# Altium footprint library connectors.PcbLib: 98 footprints (part 5 of 7)
Each footprint in its own frame and in the unit in brackets; x right, y up, seen from the top. Pads: shape width x height; smd on the part's side, far side on the other; paste and mask are expansions set on the pad; w line width, h text height; cw(c..) or ccw(c..) is an arc to the next point about the centre after c.
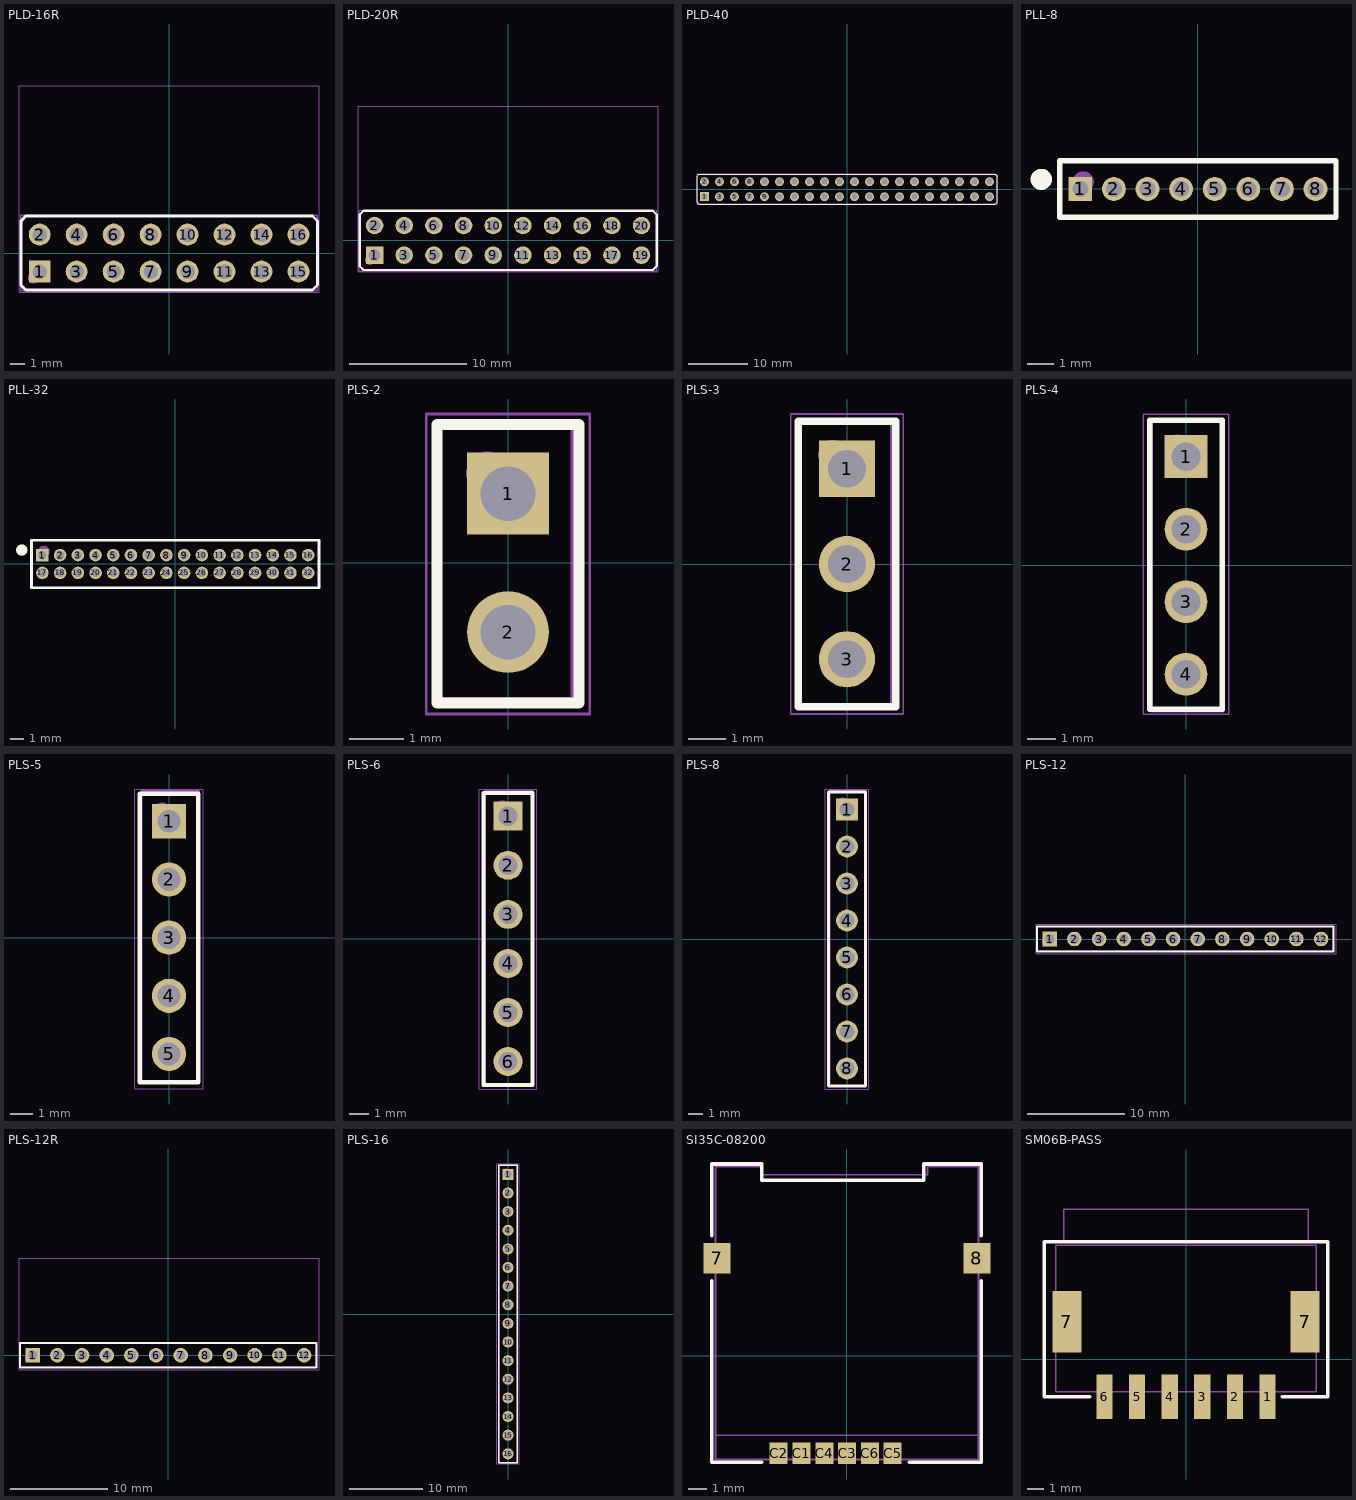
[diagram p4: the footprints below, top view; thin cyan lines are the x and y axes]

## PLD-16R [mm]
height 5
pads (16):
  rect 1.5x1.5 hole 1: 1(-8.89,-1.27)
  round 1.5 hole 1: 2(-8.89,1.27) 3(-6.35,-1.27) 4(-6.35,1.27) 5(-3.81,-1.27) 6(-3.81,1.27) 7(-1.27,-1.27) 8(-1.27,1.27) 9(1.27,-1.27) 10(1.27,1.27) 11(3.81,-1.27) 12(3.81,1.27) 13(6.35,-1.27) 14(6.35,1.27) 15(8.89,-1.27) 16(8.89,1.27)
Top Overlay:
  lines w0.2: -10.16,-2.222 -10.16,2.222 -9.842,2.54 9.85,2.54 10.19,2.2 10.19,-2.2 9.85,-2.54 -9.842,-2.54 -10.16,-2.222
Top Assy:
  circle w0.4: c-9.3,-1.7 r0.2
  lines w0.1: -10.2,-2.6 10.19,-2.6 10.19,2.6 -10.2,2.6 -10.2,-2.6
Top Cortyard:
  lines w0.05: -10.31,-2.7 10.3,-2.7 10.3,11.5 -10.31,11.5 -10.31,-2.7
3D body "DS1022-2x8RF11.stp": height 5.08, standoff -3, extent -10.2,-1.625 10.12,11.425

## PLD-20R [mm]
height 5
pads (20):
  rect 1.5x1.5 hole 1: 1(-11.43,-1.27)
  round 1.5 hole 1: 2(-11.43,1.27) 3(-8.89,-1.27) 4(-8.89,1.27) 5(-6.35,-1.27) 6(-6.35,1.27) 7(-3.81,-1.27) 8(-3.81,1.27) 9(-1.27,-1.27) 10(-1.27,1.27) 11(1.27,-1.27) 12(1.27,1.27) 13(3.81,-1.27) 14(3.81,1.27) 15(6.35,-1.27) 16(6.35,1.27) 17(8.89,-1.27) 18(8.89,1.27) 19(11.43,-1.27) 20(11.43,1.27)
Top Overlay:
  lines w0.2: -12.7,-2.222 -12.383,-2.54 12.39,-2.54 12.73,-2.2 12.73,2.2 12.39,2.54 -12.383,2.54 -12.7,2.222 -12.7,-2.222
Top Assy:
  circle w0.4: c-11.84,-1.7 r0.2
  lines w0.1: -12.74,-2.6 -12.74,2.6 12.73,2.6 12.73,-2.6 -12.74,-2.6
Top Cortyard:
  lines w0.05: -12.85,-2.7 12.84,-2.7 12.84,11.5 -12.85,11.5 -12.85,-2.7
3D body "DS1022-2x10R61.stp": height 5, standoff -3, extent -12.74,-1.52 12.66,11.52

## PLD-40 [mm]
pads (40):
  rect 1.5x1.5 hole 1: 1(-24.13,-1.27)
  round 1.5 hole 1: 2(-24.13,1.27) 3(-21.59,-1.27) 4(-21.59,1.27) 5(-19.05,-1.27) 6(-19.05,1.27) 7(-16.51,-1.27) 8(-16.51,1.27) 9(-13.97,-1.27) 10(-13.97,1.27) 11(-11.43,-1.27) 12(-11.43,1.27) 13(-8.89,-1.27) 14(-8.89,1.27) 15(-6.35,-1.27) 16(-6.35,1.27) 17(-3.81,-1.27) 18(-3.81,1.27) 19(-1.27,-1.27) 20(-1.27,1.27) 21(1.27,-1.27) 22(1.27,1.27) 23(3.81,-1.27) 24(3.81,1.27) 25(6.35,-1.27) 26(6.35,1.27) 27(8.89,-1.27) 28(8.89,1.27) 29(11.43,-1.27) 30(11.43,1.27) 31(13.97,-1.27) 32(13.97,1.27) 33(16.51,-1.27) 34(16.51,1.27) 35(19.05,-1.27) 36(19.05,1.27) 37(21.59,-1.27) 38(21.59,1.27) 39(24.13,-1.27) 40(24.13,1.27)
Top Overlay:
  lines w0.2: -25.4,-2.222 -25.082,-2.54 25.06,-2.54 25.4,-2.2 25.4,2.2 25.06,2.54 -25.082,2.54 -25.4,2.222 -25.4,-2.222
Top Assy:
  circle w0.4: c-24.5,-1.6 r0.2
  lines w0.1: -25.4,-2.5 -25.4,2.6 25.4,2.6 25.4,-2.5 -25.4,-2.5
Top Cortyard:
  lines w0.05: -25.4,-2.54 -25.4,2.54 25.4,2.54 25.4,-2.54 -25.4,-2.54

## PLL-8 [mm]
pads (8):
  rect 0.9x0.9 hole 0.6: 1(-4.445,0)
  round 0.9 hole 0.6: 2(-3.175,0) 3(-1.905,0) 4(-0.635,0) 5(0.635,0) 6(1.905,0) 7(3.175,0) 8(4.445,0)
Top Overlay:
  circle w0.4: c-5.92,0.365 r0.2
  lines w0.2: -5.22,-1.065 -5.22,1.065 5.219,1.065 5.219,-1.065 -5.22,-1.065
Top Assy:
  circle w0.4: c-4.337,0.269 r0.2
  lines w0.1: -5.22,-1.065 5.219,-1.065 5.219,1.065 -5.22,1.065 -5.22,-1.065

## PLL-32 [mm]
pads (32):
  rect 0.9x0.9 hole 0.6: 1(-9.525,0.635)
  round 0.9 hole 0.6: 2(-8.255,0.635) 3(-6.985,0.635) 4(-5.715,0.635) 5(-4.445,0.635) 6(-3.175,0.635) 7(-1.905,0.635) 8(-0.635,0.635) 9(0.635,0.635) 10(1.905,0.635) 11(3.175,0.635) 12(4.445,0.635) 13(5.715,0.635) 14(6.985,0.635) 15(8.255,0.635) 16(9.525,0.635) 17(-9.525,-0.635) 18(-8.255,-0.635) 19(-6.985,-0.635) 20(-5.715,-0.635) 21(-4.445,-0.635) 22(-3.175,-0.635) 23(-1.905,-0.635) 24(-0.635,-0.635) 25(0.635,-0.635) 26(1.905,-0.635) 27(3.175,-0.635) 28(4.445,-0.635) 29(5.715,-0.635) 30(6.985,-0.635) 31(8.255,-0.635) 32(9.525,-0.635)
Top Overlay:
  circle w0.4: c-11,1 r0.2
  lines w0.2: -10.3,-1.7 -10.3,1.7 10.3,1.7 10.3,-1.7 -10.3,-1.7
Top Assy:
  circle w0.4: c-9.417,0.904 r0.2
  lines w0.1: -10.3,-1.7 10.3,-1.7 10.3,1.7 -10.3,1.7 -10.3,-1.7

## PLS-2 [mm]
pads (2):
  rect 1.5x1.5 hole 1: 1(0,1.27)
  round 1.5 hole 1: 2(0,-1.27)
Top Overlay:
  lines w0.2: -1.3,-2.57 1.3,-2.57 1.3,2.54 -1.3,2.54 -1.3,-2.57
Top Assy:
  circle w0.4: c-0.37,1.64 r0.2
  lines w0.1: -1.3,-2.51 1.2,-2.51 1.2,2.57 -1.3,2.57 -1.3,-2.51
Top Cortyard:
  lines w0.05: -1.5,-2.77 -1.5,2.73 1.5,2.73 1.5,-2.77 -1.5,-2.77
3D body "DS1021-1x2SF11.stp": height 8.6, standoff -3, extent -1.27,-2.54 1.27,2.54

## PLS-3 [mm]
pads (3):
  rect 1.5x1.5 hole 1: 1(0,2.54)
  round 1.5 hole 1: 2(0,0) 3(0,-2.54)
Top Overlay:
  lines w0.2: -1.3,-3.81 1.3,-3.81 1.3,3.81 -1.3,3.81 -1.3,-3.81
Top Assy:
  circle w0.4: c-0.37,2.91 r0.2
  lines w0.1: -1.3,-3.8 1.2,-3.8 1.2,3.81 -1.3,3.81 -1.3,-3.8
Top Cortyard:
  lines w0.05: -1.5,-4 -1.5,4 1.5,4 1.5,-4 -1.5,-4
3D body "DS1021-1x3SF11.stp": height 8.6, standoff -3, extent -1.27,-3.81 1.27,3.81

## PLS-4 [mm]
pads (4):
  rect 1.5x1.5 hole 1: 1(0,3.81)
  round 1.5 hole 1: 2(0,1.27) 3(0,-1.27) 4(0,-3.81)
Top Overlay:
  lines w0.2: -1.27,-5.03 -1.27,5.08 1.27,5.08 1.27,-5.03 -1.27,-5.03
Top Assy:
  circle w0.4: c-0.3,4.18 r0.2
  lines w0.1: -1.2,-5.1 1.3,-5.1 1.3,5.08 -1.2,5.08 -1.2,-5.1
Top Cortyard:
  lines w0.05: -1.5,-5.2 1.5,-5.2 1.5,5.3 -1.5,5.3 -1.5,-5.2
3D body "DS1021-1x4SF11.stp": height 8.6, standoff -3, extent -1.27,-5.08 1.27,5.08

## PLS-5 [mm]
pads (5):
  rect 1.5x1.5 hole 1: 1(0,5.08)
  round 1.5 hole 1: 2(0,2.54) 3(0,0) 4(0,-2.54) 5(0,-5.08)
Top Overlay:
  lines w0.2: -1.27,-6.31 -1.27,6.29 1.27,6.29 1.27,-6.31 -1.27,-6.31
Top Assy:
  circle w0.4: c-0.3,5.49 r0.2
  lines w0.1: -1.2,-6.31 1.3,-6.31 1.3,6.39 -1.2,6.39 -1.2,-6.31
Top Cortyard:
  lines w0.05: -1.5,-6.61 1.5,-6.61 1.5,6.49 -1.5,6.49 -1.5,-6.61
3D body "DS1021-1x5SF11.stp": height 8.6, standoff -3, extent -1.2,-6.31 1.34,6.39

## PLS-6 [mm]
pads (6):
  rect 1.5x1.5 hole 1: 1(0,6.35)
  round 1.5 hole 1: 2(0,3.81) 3(0,1.27) 4(0,-1.27) 5(0,-3.81) 6(0,-6.35)
Top Overlay:
  lines w0.2: -1.27,-7.565 1.27,-7.565 1.27,7.56 -1.27,7.56 -1.27,-7.565
Top Assy:
  circle w0.4: c-0.3,6.76 r0.2
  lines w0.1: -1.2,-7.59 -1.2,7.66 1.3,7.66 1.3,-7.59 -1.2,-7.59
Top Cortyard:
  lines w0.05: -1.5,-7.77 -1.5,7.76 1.5,7.76 1.5,-7.77 -1.5,-7.77
3D body "User Library-PLS-6-1.STEP": height 8.54, standoff -3, extent -1.27,-7.63 1.27,7.61

## PLS-8 [mm]
pads (8):
  rect 1.5x1.5 hole 1: 1(0,8.89)
  round 1.5 hole 1: 2(0,6.35) 3(0,3.81) 4(0,1.27) 5(0,-1.27) 6(0,-3.81) 7(0,-6.35) 8(0,-8.89)
Top Overlay:
  lines w0.2: -1.27,-10.1 1.27,-10.1 1.27,10.1 -1.27,10.1 -1.27,-10.1
Top Assy:
  circle w0.4: c-0.3,9.3 r0.2
  lines w0.1: -1.2,-10.12 -1.2,10.2 1.3,10.2 1.3,-10.12 -1.2,-10.12
Top Cortyard:
  lines w0.05: -1.5,-10.3 -1.5,10.3 1.5,10.3 1.5,-10.3 -1.5,-10.3
3D body "DS1021-1x8SF11.stp": height 8.6, standoff -3, extent -1.27,-10.16 1.27,10.16

## PLS-12 [mm]
pads (12):
  rect 1.5x1.5 hole 1: 1(-13.97,0)
  round 1.5 hole 1: 2(-11.43,0) 3(-8.89,0) 4(-6.35,0) 5(-3.81,0) 6(-1.27,0) 7(1.27,0) 8(3.81,0) 9(6.35,0) 10(8.89,0) 11(11.43,0) 12(13.97,0)
Top Overlay:
  lines w0.2: -15.27,-1.27 -15.27,1.27 15.23,1.27 15.23,-1.27 -15.27,-1.27
Top Assy:
  circle w0.4: c-14.38,-0.3 r0.2
  lines w0.1: -15.28,-1.2 15.23,-1.2 15.23,1.3 -15.28,1.3 -15.28,-1.2
Top Cortyard:
  lines w0.05: -15.38,-1.5 15.5,-1.5 15.5,1.5 -15.38,1.5 -15.38,-1.5
3D body "DS1021-1x6SF11.stp": height 8.6, standoff -3, extent 0,-1.27 15.24,1.27
3D body "DS1021-1x6SF11.stp": height 8.6, standoff -3, extent -15.24,-1.27 0,1.27

## PLS-12R [mm]
pads (12):
  rect 1.5x1.5 hole 1: 1(-13.97,0)
  round 1.5 hole 1: 2(-11.43,0) 3(-8.89,0) 4(-6.35,0) 5(-3.81,0) 6(-1.27,0) 7(1.27,0) 8(3.81,0) 9(6.35,0) 10(8.89,0) 11(11.43,0) 12(13.97,0)
Top Overlay:
  lines w0.2: -15.27,-1.27 -15.27,1.27 15.23,1.27 15.23,-1.27 -15.27,-1.27
Top Assy:
  circle w0.4: c-14.38,-0.3 r0.2
  lines w0.1: -15.28,-1.2 15.23,-1.2 15.23,1.3 -15.28,1.3 -15.28,-1.2
Top Cortyard:
  lines w0.05: -15.38,-1.5 15.5,-1.5 15.5,10 -15.38,10 -15.38,-1.5
3D body "DS1022-1x6RDF11.stp": height 2.54, standoff -3, extent -15.24,-0.325 0,10.025
3D body "DS1022-1x6RDF11.stp": height 2.54, standoff -3, extent 0,-0.325 15.24,10.025

## PLS-16 [mm]
pads (16):
  rect 1.5x1.5 hole 1: 1(0,19.05)
  round 1.5 hole 1: 2(0,16.51) 3(0,13.97) 4(0,11.43) 5(0,8.89) 6(0,6.35) 7(0,3.81) 8(0,1.27) 9(0,-1.27) 10(0,-3.81) 11(0,-6.35) 12(0,-8.89) 13(0,-11.43) 14(0,-13.97) 15(0,-16.51) 16(0,-19.05)
Top Overlay:
  lines w0.2: -1.27,-20.24 1.27,-20.24 1.27,20.26 -1.27,20.26 -1.27,-20.24
Top Assy:
  circle w0.4: c-0.3,19.46 r0.2
  lines w0.1: -1.2,-20.36 -1.2,20.36 1.3,20.36 1.3,-20.36 -1.2,-20.36
Top Cortyard:
  lines w0.05: -1.5,-20.44 -1.5,20.46 1.5,20.46 1.5,-20.44 -1.5,-20.44

## SI35C-08200 [mm]
pads (8):
  rect 1.5x1.7 smd: 7(-7.225,5.425) 8(7.225,5.425)
  rect 1x1.2 smd: C1(-2.535,-5.425) C2(-3.805,-5.425) C3(0.005,-5.425) C4(-1.265,-5.425) C5(2.545,-5.425) C6(1.275,-5.425)
Top Overlay:
  lines w0.2: -7.535,4.175 -7.535,-5.925 -4.735,-5.925 ; -7.535,6.675 -7.535,10.675 -4.735,10.675 -4.735,9.775 4.265,9.775 4.265,10.675 7.465,10.675 7.465,6.675 ; 3.465,-5.925 7.465,-5.925 7.465,4.175
Top Assy:
  lines w0.1: -7.325,-4.425 7.325,-4.425 ; -7.325,-5.775 7.325,-5.775 7.325,10.525 4.475,10.525 4.475,10.075 -4.775,10.075 -4.775,10.525 -7.325,10.525 -7.325,-5.775
3D body "SIM7200-6-0-18-00-A_revA1.STEP": height 1.75, standoff 0, extent -7.7,-5.75 7,10.6

## SM06B-PASS [mm]
pads (8):
  rect 1x2.7 smd: 1(5,-2.3) 2(3,-2.3) 3(1,-2.3) 4(-1,-2.3) 5(-3,-2.3) 6(-5,-2.3)
  rect 1.8x3.8 smd: 7(-7.3,2.3) 7(7.3,2.3)
Top Overlay:
  lines w0.2: -5.9,-2.3 -8.7,-2.3 -8.7,7.2 8.7,7.2 8.7,-2.3 5.9,-2.3
Top Assy:
  lines w0.1: -7.5,7.2 -7.5,9.2 7.5,9.2 7.5,7.2 ; -8,-2 -8,7 8,7 8,-2 -8,-2